# Altium footprint library eHorglass.PcbLib: 1 footprints
Each footprint in its own frame and in the unit in brackets; x right, y up, seen from the top. Pads: shape width x height; smd on the part's side, far side on the other; paste and mask are expansions set on the pad; w line width, h text height; cw(c..) or ccw(c..) is an arc to the next point about the centre after c.
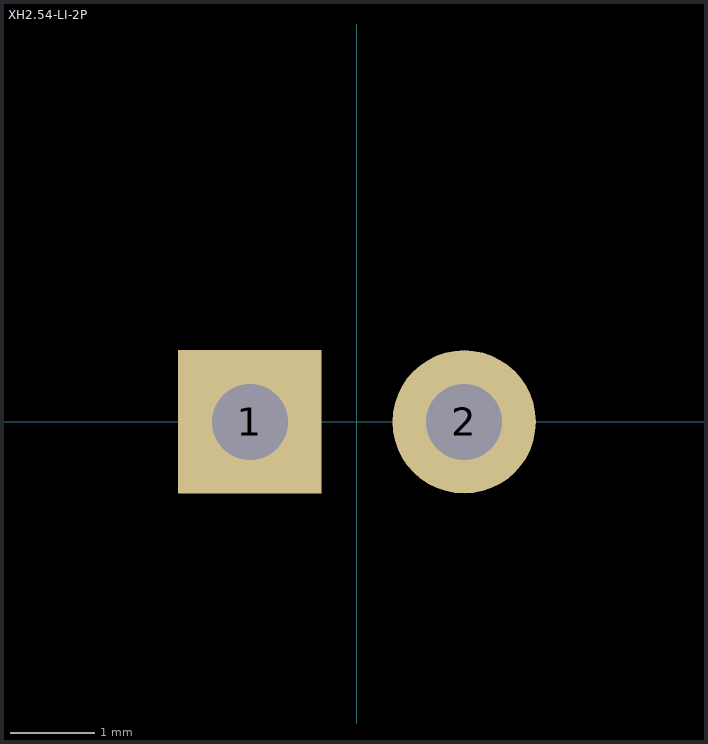
[diagram p0: the footprint, top view; thin cyan lines are the x and y axes]

## XH2.54-LI-2P [mm] "接插件，2P"
pads (2):
  rect 1.7x1.7 hole 0.9: 1(-1.27,0)
  round 1.7 hole 0.9: 2(1.27,0)
Bottom Overlay:
  lines w0.254: -3.807,-2.37 -1.067,-2.37 -1.067,-1.727 0.953,-1.727 0.953,-2.37 2.954,-2.37 3.736,-2.37 3.736,3.505 -3.807,3.505 -3.807,-2.37
3D body "XH2_54-2P.STEP": height 7.05, standoff -2.45, extent -3.77,-2.4 3.77,3.3